# Altium footprint library LongMen.PcbLib: 245 footprints (part 9 of 16)
Each footprint in its own frame and in the unit in brackets; x right, y up, seen from the top. Pads: shape width x height; smd on the part's side, far side on the other; paste and mask are expansions set on the pad; w line width, h text height; cw(c..) or ccw(c..) is an arc to the next point about the centre after c.
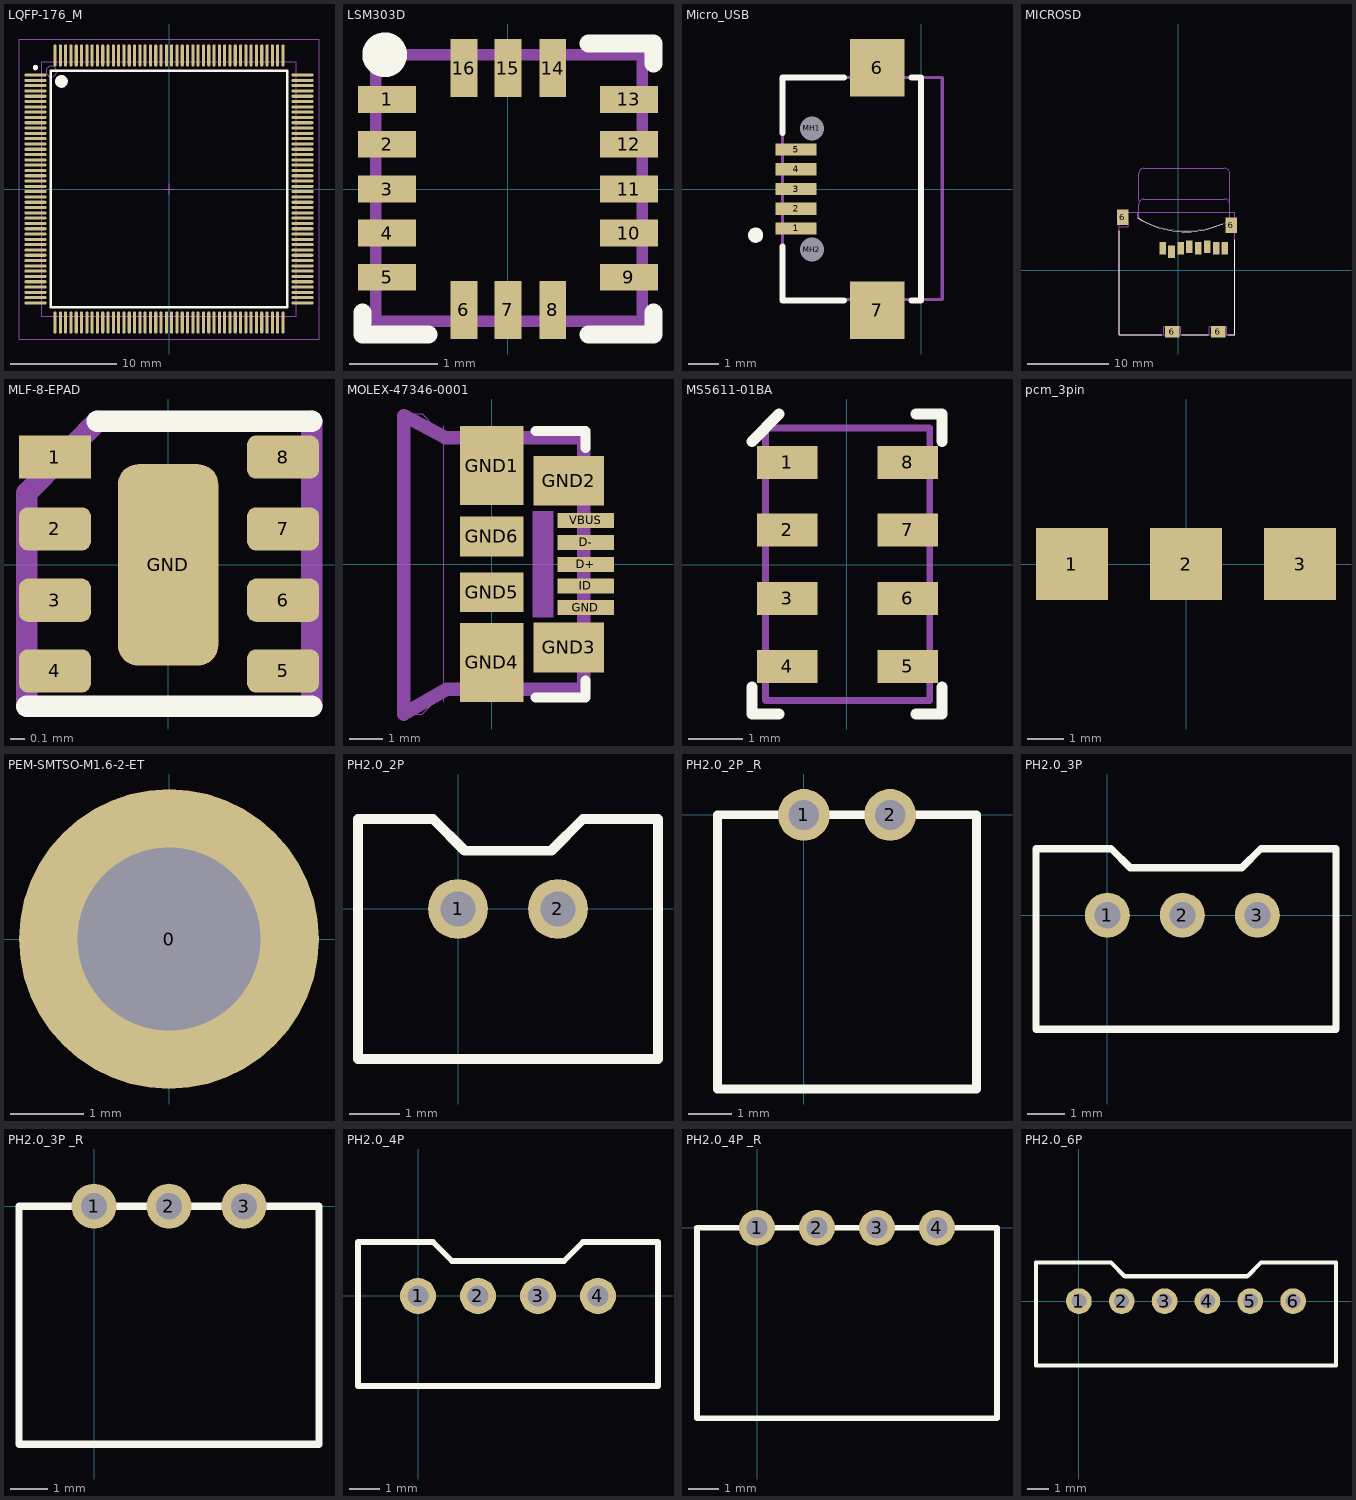
[diagram p8: the footprints below, top view; thin cyan lines are the x and y axes]

## LQFP-176_M [mm] "Thin QFP, 176-Leads, Body 24x24mm, Pitch 0.5mm, IPC Low Density"
height 1.6
pads (176):
  oval 2.1x0.3 smd: 1(-12.6,10.75) 2(-12.6,10.25) 3(-12.6,9.75) 4(-12.6,9.25) 5(-12.6,8.75) 6(-12.6,8.25) 7(-12.6,7.75) 8(-12.6,7.25) 9(-12.6,6.75) 10(-12.6,6.25) 11(-12.6,5.75) 12(-12.6,5.25) 13(-12.6,4.75) 14(-12.6,4.25) 15(-12.6,3.75) 16(-12.6,3.25) 17(-12.6,2.75) 18(-12.6,2.25) 19(-12.6,1.75) 20(-12.6,1.25) 21(-12.6,0.75) 22(-12.6,0.25) 23(-12.6,-0.25) 24(-12.6,-0.75) 25(-12.6,-1.25) 26(-12.6,-1.75) 27(-12.6,-2.25) 28(-12.6,-2.75) 29(-12.6,-3.25) 30(-12.6,-3.75) 31(-12.6,-4.25) 32(-12.6,-4.75) 33(-12.6,-5.25) 34(-12.6,-5.75) 35(-12.6,-6.25) 36(-12.6,-6.75) 37(-12.6,-7.25) 38(-12.6,-7.75) 39(-12.6,-8.25) 40(-12.6,-8.75) 41(-12.6,-9.25) 42(-12.6,-9.75) 43(-12.6,-10.25) 44(-12.6,-10.75) 89(12.6,-10.75) 90(12.6,-10.25) 91(12.6,-9.75) 92(12.6,-9.25) 93(12.6,-8.75) 94(12.6,-8.25) 95(12.6,-7.75) 96(12.6,-7.25) 97(12.6,-6.75) 98(12.6,-6.25) 99(12.6,-5.75) 100(12.6,-5.25) 101(12.6,-4.75) 102(12.6,-4.25) 103(12.6,-3.75) 104(12.6,-3.25) 105(12.6,-2.75) 106(12.6,-2.25) 107(12.6,-1.75) 108(12.6,-1.25) 109(12.6,-0.75) 110(12.6,-0.25) 111(12.6,0.25) 112(12.6,0.75) 113(12.6,1.25) 114(12.6,1.75) 115(12.6,2.25) 116(12.6,2.75) 117(12.6,3.25) 118(12.6,3.75) 119(12.6,4.25) 120(12.6,4.75) 121(12.6,5.25) 122(12.6,5.75) 123(12.6,6.25) 124(12.6,6.75) 125(12.6,7.25) 126(12.6,7.75) 127(12.6,8.25) 128(12.6,8.75) 129(12.6,9.25) 130(12.6,9.75) 131(12.6,10.25) 132(12.6,10.75)
  oval 0.3x2.1 smd: 45(-10.75,-12.6) 46(-10.25,-12.6) 47(-9.75,-12.6) 48(-9.25,-12.6) 49(-8.75,-12.6) 50(-8.25,-12.6) 51(-7.75,-12.6) 52(-7.25,-12.6) 53(-6.75,-12.6) 54(-6.25,-12.6) 55(-5.75,-12.6) 56(-5.25,-12.6) 57(-4.75,-12.6) 58(-4.25,-12.6) 59(-3.75,-12.6) 60(-3.25,-12.6) 61(-2.75,-12.6) 62(-2.25,-12.6) 63(-1.75,-12.6) 64(-1.25,-12.6) 65(-0.75,-12.6) 66(-0.25,-12.6) 67(0.25,-12.6) 68(0.75,-12.6) 69(1.25,-12.6) 70(1.75,-12.6) 71(2.25,-12.6) 72(2.75,-12.6) 73(3.25,-12.6) 74(3.75,-12.6) 75(4.25,-12.6) 76(4.75,-12.6) 77(5.25,-12.6) 78(5.75,-12.6) 79(6.25,-12.6) 80(6.75,-12.6) 81(7.25,-12.6) 82(7.75,-12.6) 83(8.25,-12.6) 84(8.75,-12.6) 85(9.25,-12.6) 86(9.75,-12.6) 87(10.25,-12.6) 88(10.75,-12.6) 133(10.75,12.6) 134(10.25,12.6) 135(9.75,12.6) 136(9.25,12.6) 137(8.75,12.6) 138(8.25,12.6) 139(7.75,12.6) 140(7.25,12.6) 141(6.75,12.6) 142(6.25,12.6) 143(5.75,12.6) 144(5.25,12.6) 145(4.75,12.6) 146(4.25,12.6) 147(3.75,12.6) 148(3.25,12.6) 149(2.75,12.6) 150(2.25,12.6) 151(1.75,12.6) 152(1.25,12.6) 153(0.75,12.6) 154(0.25,12.6) 155(-0.25,12.6) 156(-0.75,12.6) 157(-1.25,12.6) 158(-1.75,12.6) 159(-2.25,12.6) 160(-2.75,12.6) 161(-3.25,12.6) 162(-3.75,12.6) 163(-4.25,12.6) 164(-4.75,12.6) 165(-5.25,12.6) 166(-5.75,12.6) 167(-6.25,12.6) 168(-6.75,12.6) 169(-7.25,12.6) 170(-7.75,12.6) 171(-8.25,12.6) 172(-8.75,12.6) 173(-9.25,12.6) 174(-9.75,12.6) 175(-10.25,12.6) 176(-10.75,12.6)
Top Overlay:
  circle w0.25: c-12.6,11.45 r0.125
  circle w0.6: c-10.15,10.15 r0.3
  lines w0.2: -11.15,-11.15 -11.15,11.15 11.15,11.15 11.15,-11.15 -11.15,-11.15
Mechanical 13:
  circle w0.1: c-11.1,11.1 r0.5
  lines w0.1: -12,-12 -12,12 12,12 12,-12 -12,-12
Mechanical 15:
  lines w0.1: -0.5,0 0.5,0 ; 0,-0.5 0,0.5 ; -14.15,-14.15 -14.15,14.15 14.15,14.15 14.15,-14.15 -14.15,-14.15
3D body: height 1.6, standoff 0, extent -12,-12 12,12

## LSM303D [mil] "LGA-16L"
pads (16):
  rect 26x12 smd mask+0: 1(-53.94,40) 2(-53.94,20) 3(-53.94,0) 4(-53.94,-19.69) 5(-53.94,-39.37) 9(54,-39.37) 10(54,-19.69) 11(54,0) 12(54,20) 13(54,40)
  rect 12x26 smd mask+0: 6(-19.68,-53.94) 7(0,-53.94) 8(20,-53.94) 14(20,54) 15(0,54) 16(-19.68,54)
Top Overlay:
  circle w10: c-55,60 r5
  lines w8: -64.96,-55.12 -64.96,-64.96 -35.43,-64.96 ; 36,-64.96 65,-64.96 65,-55.12 ; 36,65 65,65 65,56
Mechanical 16:
  lines w5: -59.06,-59.06 -59.06,60 60,60 60,-59.06 -59.06,-59.06
3D body: height -16.54, standoff -56.69, extent -59.06,-59.06 59.06,59.06

## Micro_USB [mm] "Connector; USB2.0, Type B, SM; 5 Position; Right Angle"
height 3
pads (9):
  rect 1.35x0.4 smd: 1(-4.125,-1.3) 2(-4.125,-0.65) 3(-4.125,0) 4(-4.125,0.65) 5(-4.125,1.3)
  rect 1.8x1.9 smd: 6(-1.45,4) 7(-1.45,-4)
  round 0.6 hole 0.8 unplated: MH1(-3.6,2) MH2(-3.6,-2)
Top Overlay:
  circle w0.25: c-5.461,-1.524 r0.125
  lines w0.2: -4.572,-1.905 -4.572,-3.682 -2.538,-3.684 ; -4.572,1.844 -4.572,3.681 -2.538,3.684 ; -0.319,-3.683 0,-3.683 0,3.683 -0.319,3.683
Mechanical 1:
  lines w0.1: 0,-3.683 0,3.683
  text "PCB Edge" at 0.381,-3.302 h0.25
Mechanical 13:
  lines w0.1: -4.572,-3.645 -4.572,1.842 -4.57,1.844 -4.568,3.683 0.7,3.683 0.7,-3.645 -4.572,-3.645
Mechanical 16:
  lines w0.1: -1.905,-4.445 -0.889,-4.445 -0.889,-3.683 -1.905,-3.683 -1.905,-4.445 ; -1.905,3.683 -1.905,4.445 -0.889,4.445 -0.889,3.683 -1.905,3.683
3D body: height 2.72, standoff -0.22, extent -4.682,-3.99 0.748,3.99

## MICROSD [mil] "MICROSD"
pads (12):
  rect 32x60 smd: 1(-76.38,107) 2(-33.07,91) 3(11,107) 4(54,115) 5(97,107) 6(141,115) 7(184,107) 8(227,107)
  rect 56x75 smd: 6(-269.69,258) 6(258,219)
  rect 71x56 smd: 6(-29.53,-299.21) 6(195,-299.21)
Top Overlay:
  lines w5: -287.4,193 -287.4,-314.96 -80.71,-314.96 ; -196.85,256 ccw(c35.12,618.63) 216,228 ; 17,-314.96 145,-314.96 ; 242,-314.96 276,-314.96 276,150
Mechanical 16:
  lines w0: -192.91,252 -192.91,322 cw(c-167.81,321.9) -167.7,347 225,347 cw(c224.5,319.5) 252,319 252,249 ; -192.91,339 -192.91,471 cw(c-167.31,471.4) -167.7,497 225,497 cw(c224.5,469.5) 252,469 252,331
  lines w4: -287.4,-314.96 -287.4,284 276,284 276,-314.96 -287.4,-314.96
  lines w5: -287.4,-314.96 -70.87,-314.96 -70.87,-275.59 -59.06,-275.59 -59.06,-314.96 -3.94,-314.96 -3.94,-275.59 12,-275.59 12,-314.96 150,-314.96 150,-275.59 162,-275.59 162,-314.96 221,-314.96 221,-275.59 237,-275.59 237,-314.96 276,-314.96 276,249 256,249 252,245 cw(c37.61,660) -196.85,256 -196.85,284 -287.4,284 -287.4,233 -244.09,233 -244.09,213 -287.4,213 -287.4,-314.96
Mechanical 30:
  text "card OUT" at -51.18,457 h49.6
  text "card IN" at -27.56,308 h49.6
3D body: height 72.83, standoff -1.97, extent -275.59,-315.2 275.59,285.2

## MLF-8-EPAD [mil] "MLF-8-EPAD"
pads (9):
  rect 20x12 smd: 1(-31.5,30)
  rrect40% 20x12 smd: 2(-31.5,10) 3(-31.5,-9.84) 4(-31.5,-29.53) 5(32,-29.53) 6(32,-9.84) 7(32,10) 8(32,30)
  rrect40% 28x56 smd: GND(0,0)
Top Overlay:
  lines w6: -39.37,-39.37 40,-39.37 ; -19.68,40 40,40
Mechanical 16:
  lines w6: -39.37,-39.37 -39.37,20 -19.68,40 ; 40,-39.37 40,40
3D body: height 33.46, standoff 0, extent -39.76,-39.37 39.76,39.37

## MOLEX-47346-0001 [mil]
pads (11):
  rect 67x18 smd: D+(111,0) D-(111,26) GND(111,-51.18) ID(111,-25.59) VBUS(111,52)
  rect 75x94 smd: GND1(0,117) GND4(0,-116.14)
  rect 83x59 smd: GND2(91,99) GND3(91,-98.43)
  rect 75x47 smd: GND5(0,-32.97) GND6(0,33)
Top Overlay:
  lines w12: 52,-157.48 111,-157.48 111,-137.8 ; 52,158 111,158 111,138
Mechanical 8:
  rectangle: 48,-62.99 73,63
Mechanical 16:
  lines w0: -57.09,-163.39 -57.09,164
  lines w1: -106.3,-177.17 -106.3,178 -82.68,178 -55.12,150 107,150 111,146 111,-145.67 107,-149.61 -55.12,-149.61 -82.68,-177.17 -106.3,-177.17
  lines w16: -104.33,-177.17 -104.33,176 -55.12,150 109,150 109,-147.64 -53.15,-147.64 -104.33,-177.17
3D body: height 107.09, standoff -8.66, extent -93.7,-157.09 120.07,157.09

## MS5611-01BA [mil] "MS5611-01BA"
pads (8):
  rect 44x24 smd: 1(-43.31,74) 2(-43.31,25) 3(-43.31,-24.61) 4(-43.31,-73.82) 5(44,-73.82) 6(44,-24.61) 7(44,25) 8(44,74)
Top Overlay:
  lines w8: -68.9,-88.58 -68.9,-108.27 -49.21,-108.27 ; -68.9,89 -49.21,109 ; 50,-108.27 69,-108.27 69,-88.58 ; 50,109 69,109 69,89
Mechanical 16:
  lines w1: -59.06,-98.43 60,-98.43 60,99 -59.06,99 -59.06,-98.43
  lines w5: -59.06,-98.43 60,-98.43 60,99 -59.06,99 -59.06,-98.43
3D body: height 39.37, standoff -1.97, extent -59.32,-97.97 58.79,98.88

## pcm_3pin [mm]
pads (3):
  rect 2x2 smd: 1(-3.175,0) 2(0,0) 3(3.175,0)

## PEM-SMTSO-M1.6-2-ET [mm] "Surface mount thread"
height 2
pads (1):
  round 4.1 hole 2.5 paste-2 mask-2: 0(0,0)
Top Paste:
  lines w1: -1.414,-0.707 ccw(c0,0) -0.707,-1.414 ; -1.414,0.707 cw(c0,0) -0.707,1.414 ; 0.707,-1.414 ccw(c0,0) 1.414,-0.707 ; 0.707,1.414 cw(c0,0) 1.414,0.707
Top Solder:
  lines w1: -1.414,-0.707 ccw(c0,0) -0.707,-1.414 ; -1.414,0.707 cw(c0,0) -0.707,1.414 ; 0.707,-1.414 ccw(c0,0) 1.414,-0.707 ; 0.707,1.414 cw(c0,0) 1.414,0.707
3D body: height 2, standoff -0.48, extent -1.59,-1.83 1.59,1.83

## PH2.0_2P [mm]
pads (2):
  round 1.2 hole 0.7: 1(0,0) 2(2,0)
Top Overlay:
  lines w0.2: 4,-3 4,1.8 2.5,1.8 1.865,1.165 0.135,1.165 -0.5,1.8 -2,1.8 -2,-3 3.995,-3 4,-2.995
3D body: height 6, standoff -3.44, extent -2,-3.1 4,1.7

## PH2.0_2P _R [mm]
pads (2):
  round 1.2 hole 0.7: 1(0,0) 2(2,0)
Top Overlay:
  lines w0.2: -2,-6.35 4,-6.35 4,0 -2,0 -2,-6.35
3D body: height 4.8, standoff -3.15, extent -2,-6.45 4,0.25

## PH2.0_3P [mm]
pads (3):
  round 1.2 hole 0.7: 1(0,0) 2(2,0) 3(4,0)
Top Overlay:
  lines w0.2: -1.905,-3.048 -1.905,1.778 0.095,1.778 0.603,1.27 3.588,1.27 4.096,1.778 6.096,1.778 6.096,-3.048 -1.905,-3.048
3D body: height 6, standoff -3.44, extent -2,-3.1 6,1.7

## PH2.0_3P _R [mm]
pads (3):
  round 1.2 hole 0.7: 1(0,0) 2(2,0) 3(4,0)
Top Overlay:
  lines w0.2: -2,-6.35 6,-6.35 6,0 -2,0 -2,-6.35
3D body: height 4.8, standoff -3.15, extent -2,-6.45 6,0.25

## PH2.0_4P [mm]
pads (4):
  round 1.2 hole 0.7: 1(0,0) 2(2,0) 3(4,0) 4(6,0)
Top Overlay:
  lines w0.2: -2,-3 8,-3 8,1.8 5.5,1.8 4.865,1.165 1.135,1.165 0.5,1.8 -2,1.8 -2,-3
3D body: height 6, standoff -3.44, extent -2,-3.1 8,1.7

## PH2.0_4P _R [mm]
pads (4):
  round 1.2 hole 0.7: 1(0,0) 2(2,0) 3(4,0) 4(6,0)
Top Overlay:
  lines w0.2: -2,-6.35 8,-6.35 8,0 -2,0 -2,-6.35
3D body: height 4.8, standoff -3.15, extent -2,-6.45 8,0.25

## PH2.0_6P [mm]
pads (6):
  round 1.2 hole 0.7: 1(0,0) 2(2,0) 3(4,0) 4(6,0) 5(8,0) 6(10,0)
Top Overlay:
  lines w0.2: 11.97,-3 -2,-3 -2,1.8 1.5,1.8 2.135,1.165 7.865,1.165 8.5,1.8 12,1.8 12,-3
3D body: height 6, standoff -3.44, extent -2,-3.1 12,1.7